# Altium schematic symbol library LATTICEPLDS_Library.SchLib: 291 symbols (part 4 of 32) (continued)
## LCMXO2-1200U/2K/4K/7K-FTG256 (continued)
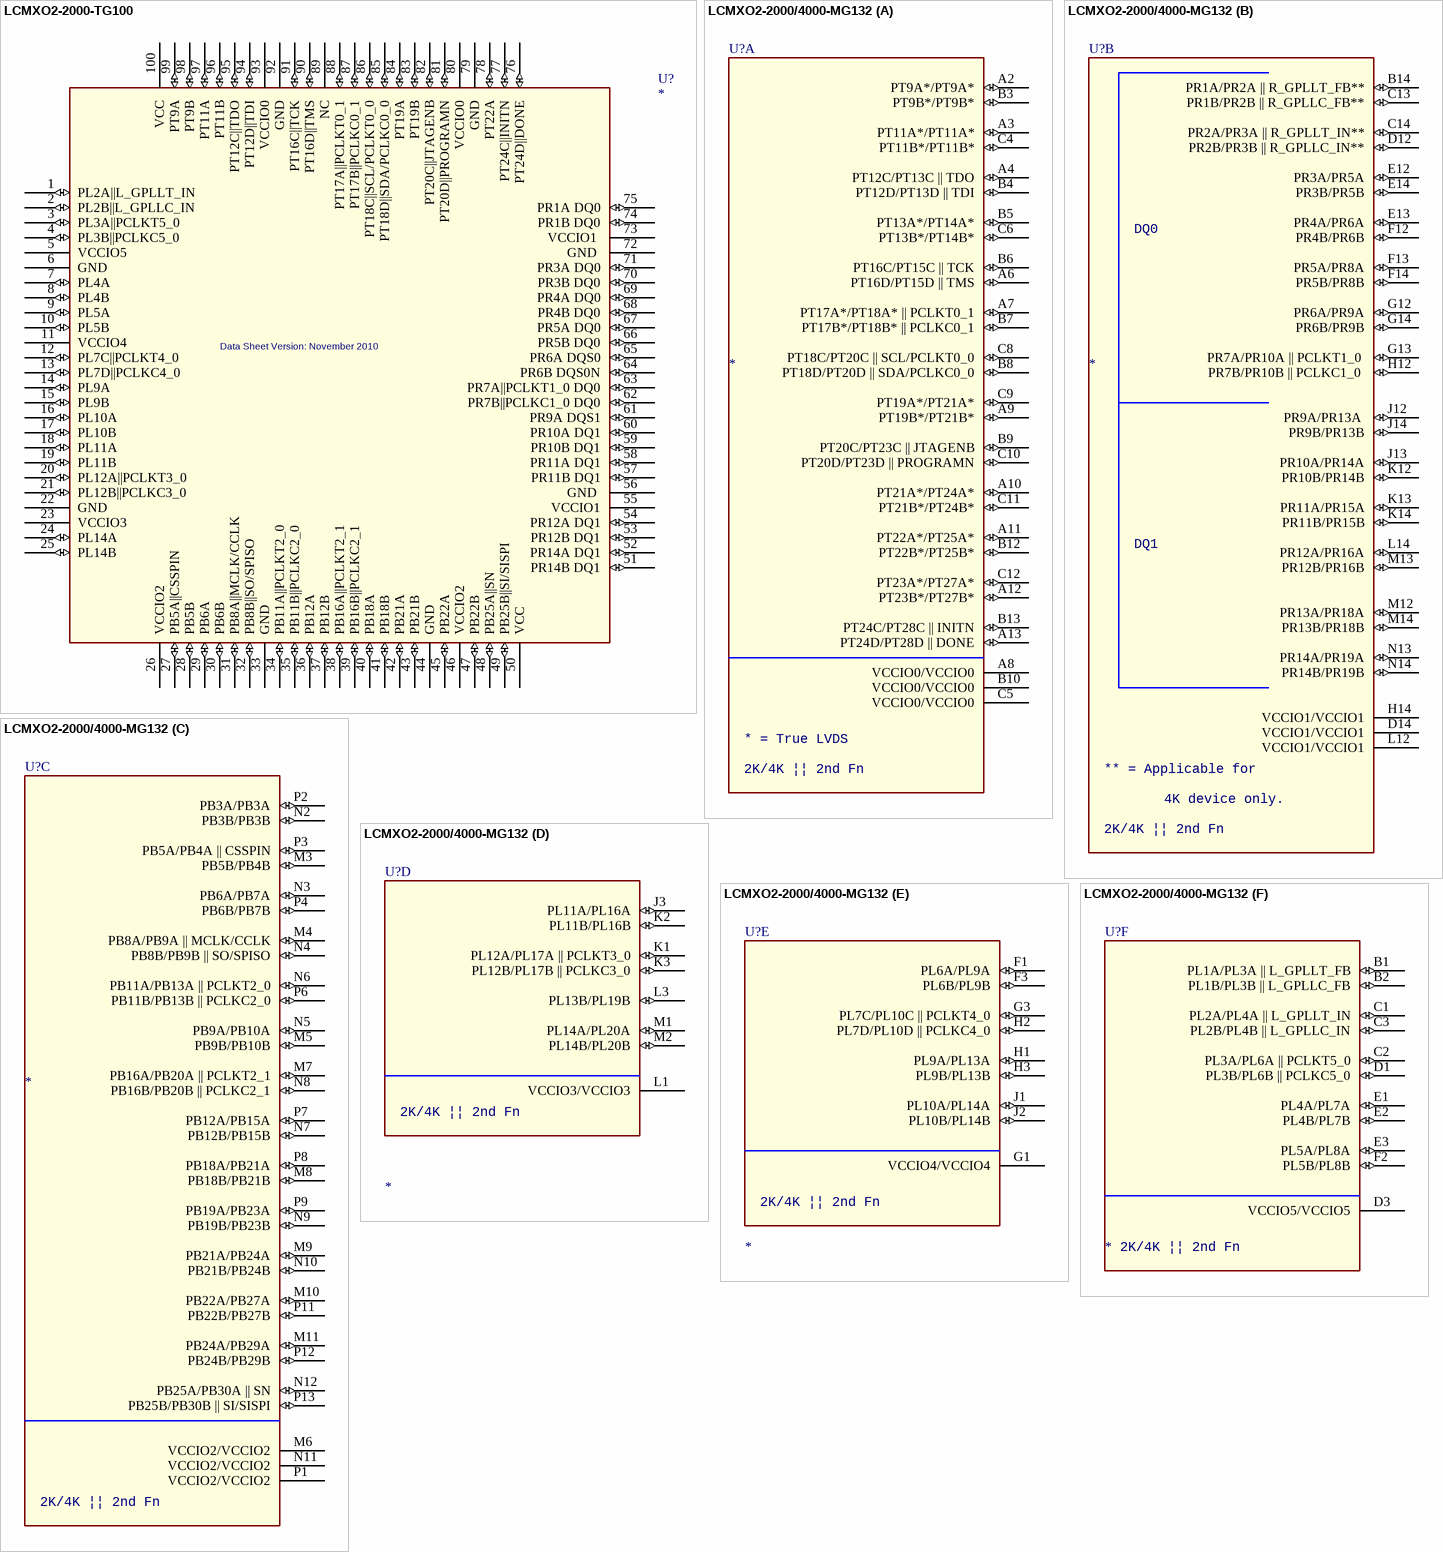
[diagram p41: symbols LCMXO2-2000-TG100 to LCMXO2-2000/4000-MG132]
part A text: 1200U&2K/4K/7K || ALL; (PRI. || SEC.); *=TRUE LVDS; *= Out. Gearbox; A,C = P; B,D = N
part B text: R_GPLL:; 4K&8K; Only; DQS0; DQS1; 1200U&2K/4K/7K || ALL; (PRI. || SEC.); A,C = P; B,D = N
part C text: 1200U&2K/4K/7K || ALL; (PRI. || SEC.); A,C = P; B,D = N; @ = In. Gearbox
part D text: 1200U&2K/4K/7K || ALL; (PRI. || SEC.); A,C = P; B,D = N
part E text: 1200U&2K/4K/7K || ALL; (PRI. || SEC.); A,C = P; B,D = N
part F text: 1200U&2K/4K/7K || ALL; (PRI. || SEC.); A,C = P; B,D = N

## LCMXO2-2000-TG100
designator U?  Data Sheet Version: November 2010
pins: 1 PL2A||L_GPLLT_IN  (io), 2 PL2B||L_GPLLC_IN  (io), 3 PL3A||PCLKT5_0  (io), 4 PL3B||PCLKC5_0  (io), 5 VCCIO5  (power), 6 GND  (power), 7 PL4A  (io), 8 PL4B  (io), 9 PL5A  (io), 10 PL5B  (io), 11 VCCIO4  (power), 12 PL7C||PCLKT4_0  (io), 13 PL7D||PCLKC4_0  (io), 14 PL9A  (io), 15 PL9B  (io), 16 PL10A  (io), 17 PL10B  (io), 18 PL11A  (io), 19 PL11B  (io), 20 PL12A||PCLKT3_0  (io), 21 PL12B||PCLKC3_0  (io), 22 GND  (power), 23 VCCIO3  (power), 24 PL14A  (io), 25 PL14B  (io), 26 VCCIO2  (power), 27 PB5A||CSSPIN  (io), 28 PB5B  (io), 29 PB6A  (io), 30 PB6B  (io), 31 PB8A||MCLK/CCLK  (io), 32 PB8B||SO/SPISO  (io), 33 GND  (power), 34 PB11A||PCLKT2_0  (io), 35 PB11B||PCLKC2_0  (io), 36 PB12A  (io), 37 PB12B  (io), 38 PB16A||PCLKT2_1  (io), 39 PB16B||PCLKC2_1  (io), 40 PB18A  (io), 41 PB18B  (io), 42 PB21A  (io), 43 PB21B  (io), 44 GND  (power), 45 PB22A  (io), 46 VCCIO2  (power), 47 PB22B  (io), 48 PB25A||SN  (io), 49 PB25B||SI/SISPI  (io), 50 VCC  (power), 51 PR14B DQ1 (io), 52 PR14A DQ1 (io), 53 PR12B DQ1 (io), 54 PR12A DQ1 (io), 55 VCCIO1 (power), 56 GND  (power), 57 PR11B DQ1 (io), 58 PR11A DQ1 (io), 59 PR10B DQ1 (io), 60 PR10A DQ1 (io), 61 PR9A DQS1 (io), 62 PR7B||PCLKC1_0 DQ0 (io), 63 PR7A||PCLKT1_0 DQ0 (io), 64 PR6B DQS0N (io), 65 PR6A DQS0 (io), 66 PR5B DQ0 (io), 67 PR5A DQ0 (io), 68 PR4B DQ0 (io), 69 PR4A DQ0 (io), 70 PR3B DQ0 (io), 71 PR3A DQ0 (io), 72 GND  (power), 73 VCCIO1  (power), 74 PR1B DQ0 (io), 75 PR1A DQ0 (io), 76 PT24D||DONE  (io), 77 PT24C||INITN  (io), 78 PT22A  (io), 79 GND  (power), 80 VCCIO0  (power), 81 PT20D||PROGRAMN  (io), 82 PT20C||JTAGENB  (io), 83 PT19B  (io), 84 PT19A  (io), 85 PT18D||SDA/PCLKC0_0  (io), 86 PT18C||SCL/PCLKT0_0  (io), 87 PT17B||PCLKC0_1  (io), 88 PT17A||PCLKT0_1  (io), 89 NC , 90 PT16D||TMS  (io), 91 PT16C||TCK  (io), 92 GND  (power), 93 VCCIO0  (power), 94 PT12D||TDI  (io), 95 PT12C||TDO  (io), 96 PT11B  (io), 97 PT11A  (io), 98 PT9B  (io), 99 PT9A  (io), 100 VCC  (power)

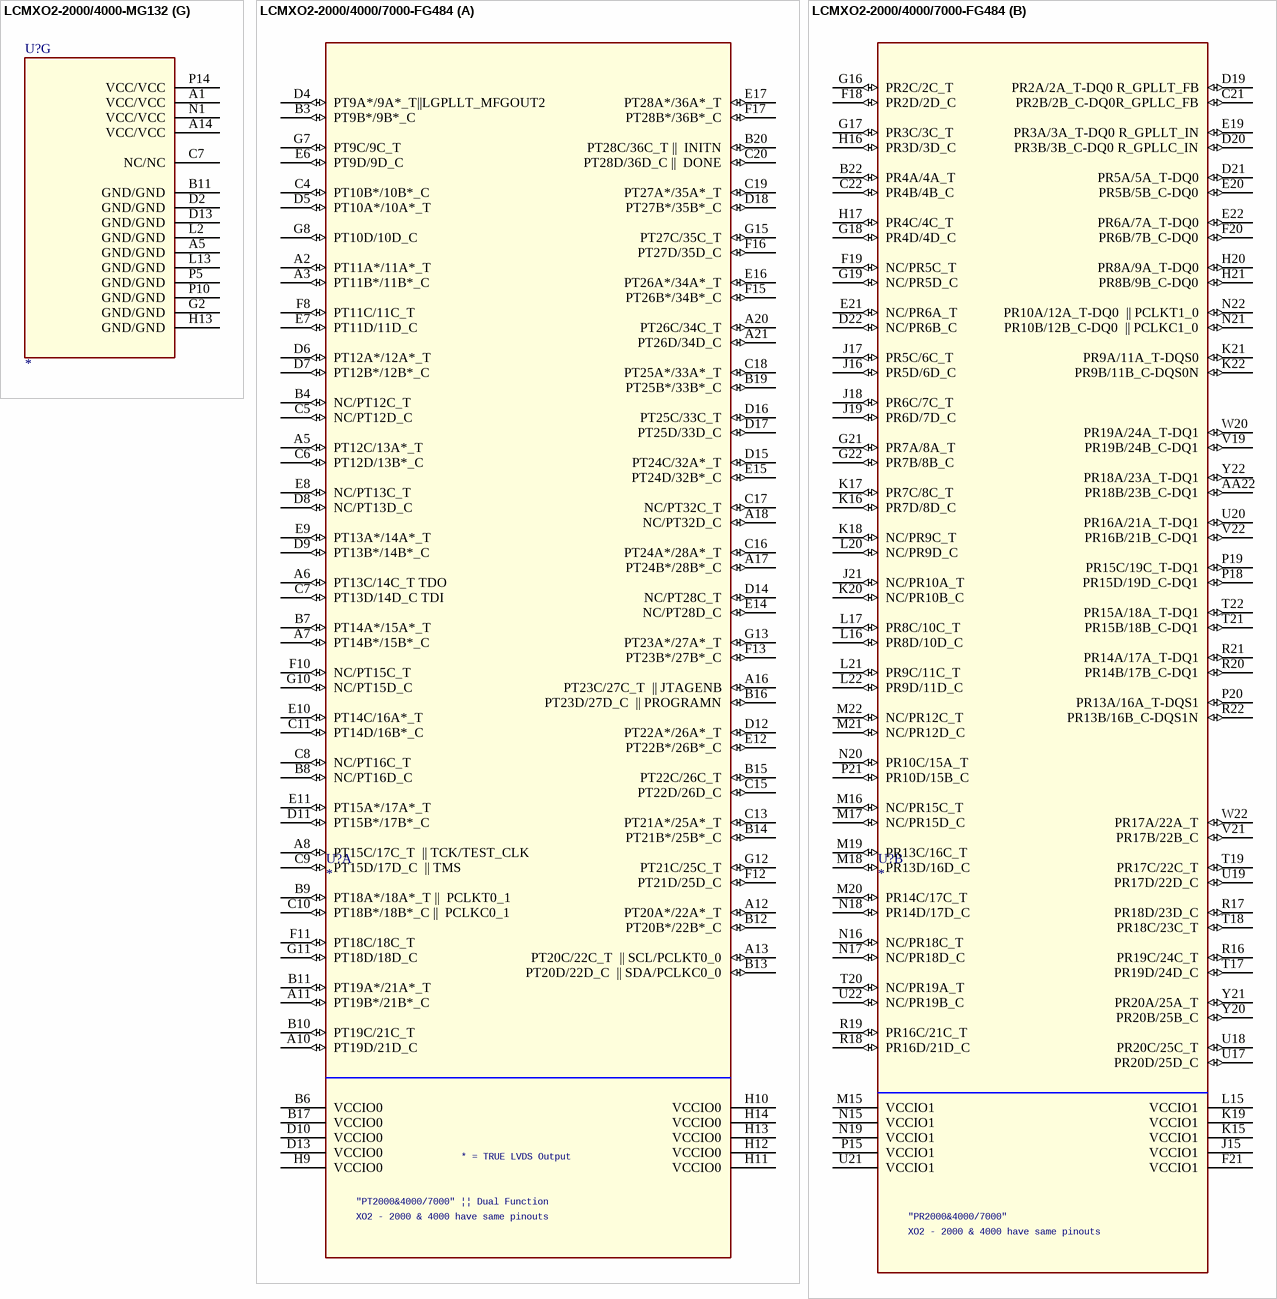
[diagram p42: symbols LCMXO2-2000/4000-MG132 to LCMXO2-2000/4000/7000-FG484]

## LCMXO2-2000/4000-MG132
designator U?
SPLIT_INST: TRUE; SWAP_INFO: (S1+S2+S3+S4+S5+S6+S7)
part A pins: A2 PT9A*/PT9A* (io), A3 PT11A*/PT11A* (io), A4 PT12C/PT13C || TDO (io), A6 PT16D/PT15D || TMS (io), A7 PT17A*/PT18A* || PCLKT0_1 (io), A8 VCCIO0/VCCIO0 (power), A9 PT19B*/PT21B* (io), A10 PT21A*/PT24A* (io), A11 PT22A*/PT25A* (io), A12 PT23B*/PT27B* (io), A13 PT24D/PT28D || DONE (io), B3 PT9B*/PT9B* (io), B4 PT12D/PT13D || TDI (io), B5 PT13A*/PT14A* (io), B6 PT16C/PT15C || TCK (io), B7 PT17B*/PT18B* || PCLKC0_1 (io), B8 PT18D/PT20D || SDA/PCLKC0_0 (io), B9 PT20C/PT23C || JTAGENB (io), B10 VCCIO0/VCCIO0 (power), B12 PT22B*/PT25B* (io), B13 PT24C/PT28C || INITN (io), C4 PT11B*/PT11B* (io), C5 VCCIO0/VCCIO0 (power), C6 PT13B*/PT14B* (io), C8 PT18C/PT20C || SCL/PCLKT0_0 (io), C9 PT19A*/PT21A* (io), C10 PT20D/PT23D || PROGRAMN (io), C11 PT21B*/PT24B* (io), C12 PT23A*/PT27A* (io)
part B pins: B14 PR1A/PR2A || R_GPLLT_FB** (io), C13 PR1B/PR2B || R_GPLLC_FB** (io), C14 PR2A/PR3A || R_GPLLT_IN** (io), D12 PR2B/PR3B || R_GPLLC_IN** (io), D14 VCCIO1/VCCIO1 (power), E12 PR3A/PR5A (io), E13 PR4A/PR6A (io), E14 PR3B/PR5B (io), F12 PR4B/PR6B (io), F13 PR5A/PR8A (io), F14 PR5B/PR8B (io), G12 PR6A/PR9A (io), G13 PR7A/PR10A || PCLKT1_0  (io), G14 PR6B/PR9B (io), H12 PR7B/PR10B || PCLKC1_0  (io), H14 VCCIO1/VCCIO1 (power), J12 PR9A/PR13A  (io), J13 PR10A/PR14A (io), J14 PR9B/PR13B (io), K12 PR10B/PR14B (io), K13 PR11A/PR15A (io), K14 PR11B/PR15B (io), L12 VCCIO1/VCCIO1 (power), L14 PR12A/PR16A (io), M12 PR13A/PR18A (io), M13 PR12B/PR16B (io), M14 PR13B/PR18B (io), N13 PR14A/PR19A (io), N14 PR14B/PR19B (io)
part C pins: M3 PB5B/PB4B (io), M4 PB8A/PB9A || MCLK/CCLK (io), M5 PB9B/PB10B (io), M6 VCCIO2/VCCIO2 (power), M7 PB16A/PB20A || PCLKT2_1 (io), M8 PB18B/PB21B (io), M9 PB21A/PB24A (io), M10 PB22A/PB27A (io), M11 PB24A/PB29A (io), N2 PB3B/PB3B (io), N3 PB6A/PB7A (io), N4 PB8B/PB9B || SO/SPISO (io), N5 PB9A/PB10A (io), N6 PB11A/PB13A || PCLKT2_0 (io), N7 PB12B/PB15B (io), N8 PB16B/PB20B || PCLKC2_1 (io), N9 PB19B/PB23B (io), N10 PB21B/PB24B (io), N11 VCCIO2/VCCIO2 (power), N12 PB25A/PB30A || SN (io), P1 VCCIO2/VCCIO2 (power), P2 PB3A/PB3A (io), P3 PB5A/PB4A || CSSPIN (io), P4 PB6B/PB7B (io), P6 PB11B/PB13B || PCLKC2_0 (io), P7 PB12A/PB15A (io), P8 PB18A/PB21A (io), P9 PB19A/PB23A (io), P11 PB22B/PB27B (io), P12 PB24B/PB29B (io), P13 PB25B/PB30B || SI/SISPI (io)
part D pins: J3 PL11A/PL16A (io), K1 PL12A/PL17A || PCLKT3_0 (io), K2 PL11B/PL16B (io), K3 PL12B/PL17B || PCLKC3_0 (io), L1 VCCIO3/VCCIO3 (power), L3 PL13B/PL19B (io), M1 PL14A/PL20A (io), M2 PL14B/PL20B (io)
part E pins: F1 PL6A/PL9A (io), F3 PL6B/PL9B (io), G1 VCCIO4/VCCIO4 (power), G3 PL7C/PL10C || PCLKT4_0 (io), H1 PL9A/PL13A (io), H2 PL7D/PL10D || PCLKC4_0 (io), H3 PL9B/PL13B (io), J1 PL10A/PL14A (io), J2 PL10B/PL14B (io)
part F pins: B1 PL1A/PL3A || L_GPLLT_FB (io), B2 PL1B/PL3B || L_GPLLC_FB (io), C1 PL2A/PL4A || L_GPLLT_IN (io), C2 PL3A/PL6A || PCLKT5_0 (io), C3 PL2B/PL4B || L_GPLLC_IN (io), D1 PL3B/PL6B || PCLKC5_0 (io), D3 VCCIO5/VCCIO5 (power), E1 PL4A/PL7A (io), E2 PL4B/PL7B (io), E3 PL5A/PL8A (io), F2 PL5B/PL8B (io)
part G pins: A1 VCC/VCC (power), A5 GND/GND (power), A14 VCC/VCC (power), B11 GND/GND (power), C7 NC/NC, D2 GND/GND (power), D13 GND/GND (power), G2 GND/GND (power), H13 GND/GND (power), L2 GND/GND (power), L13 GND/GND (power), N1 VCC/VCC (power), P5 GND/GND (power), P10 GND/GND (power), P14 VCC/VCC (power)
part A text: * = True LVDS; 2K/4K || 2nd Fn
part B text: DQ0; DQ1; ** = Applicable for; 4K device only.; 2K/4K || 2nd Fn
part C text: 2K/4K || 2nd Fn
part D text: 2K/4K || 2nd Fn
part E text: 2K/4K || 2nd Fn
part F text: 2K/4K || 2nd Fn

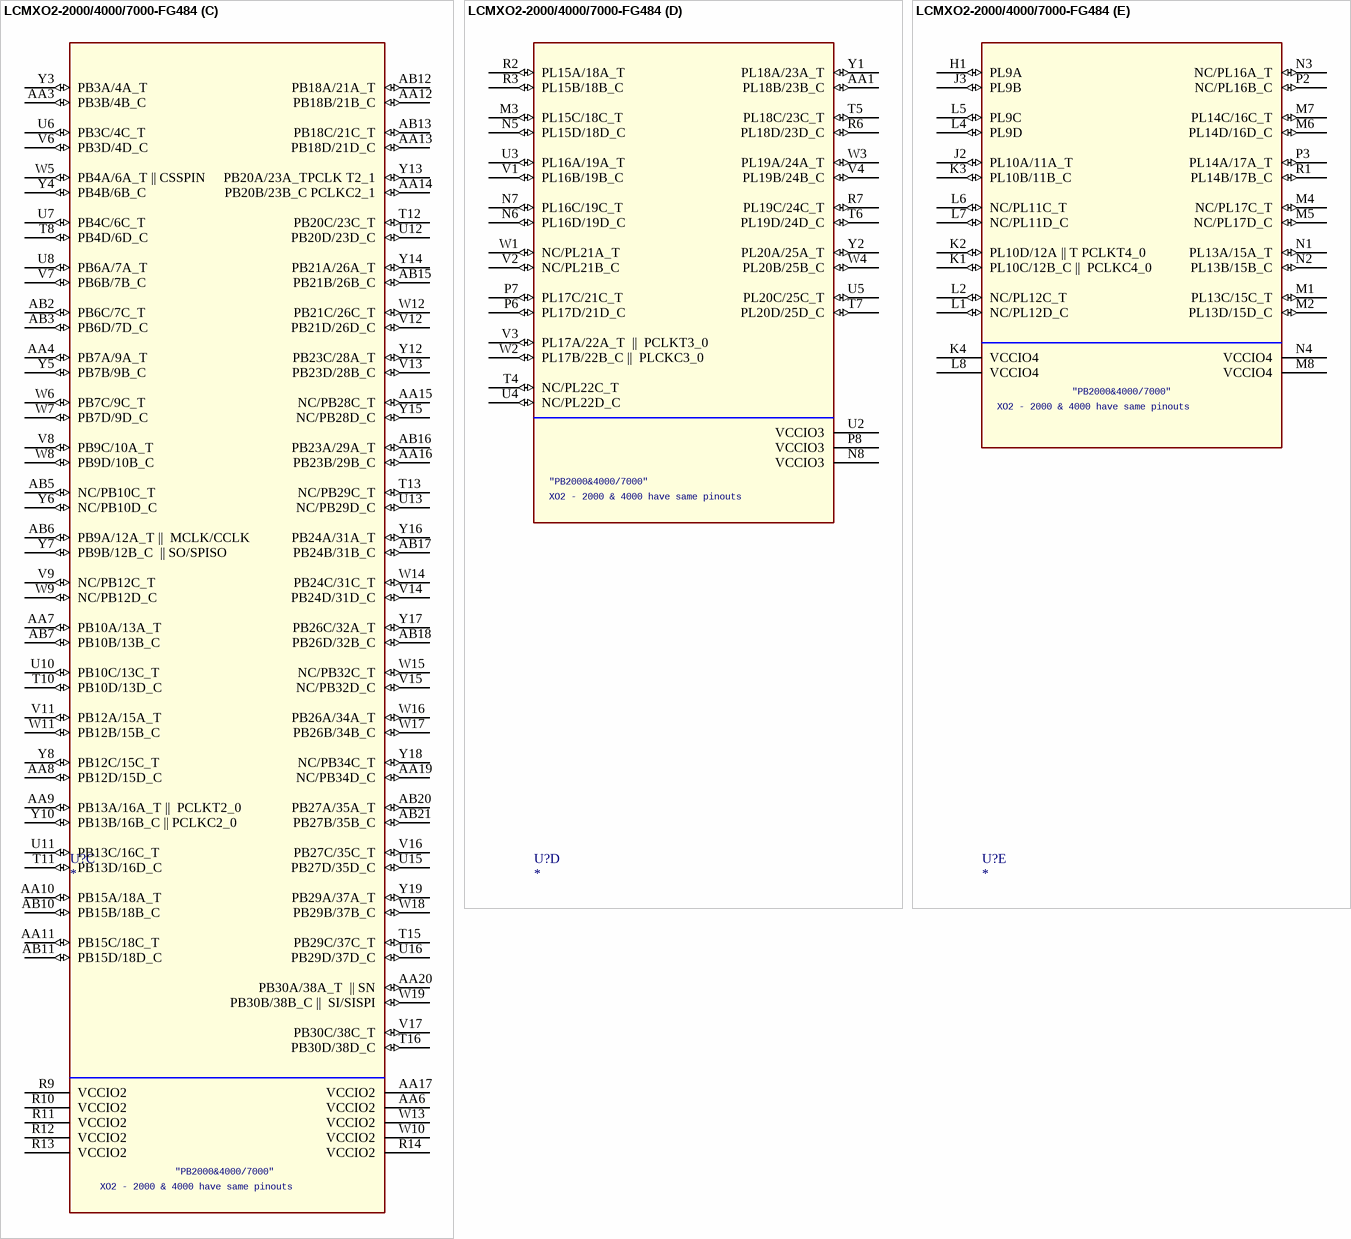
[diagram p43: symbol LCMXO2-2000/4000/7000-FG484]

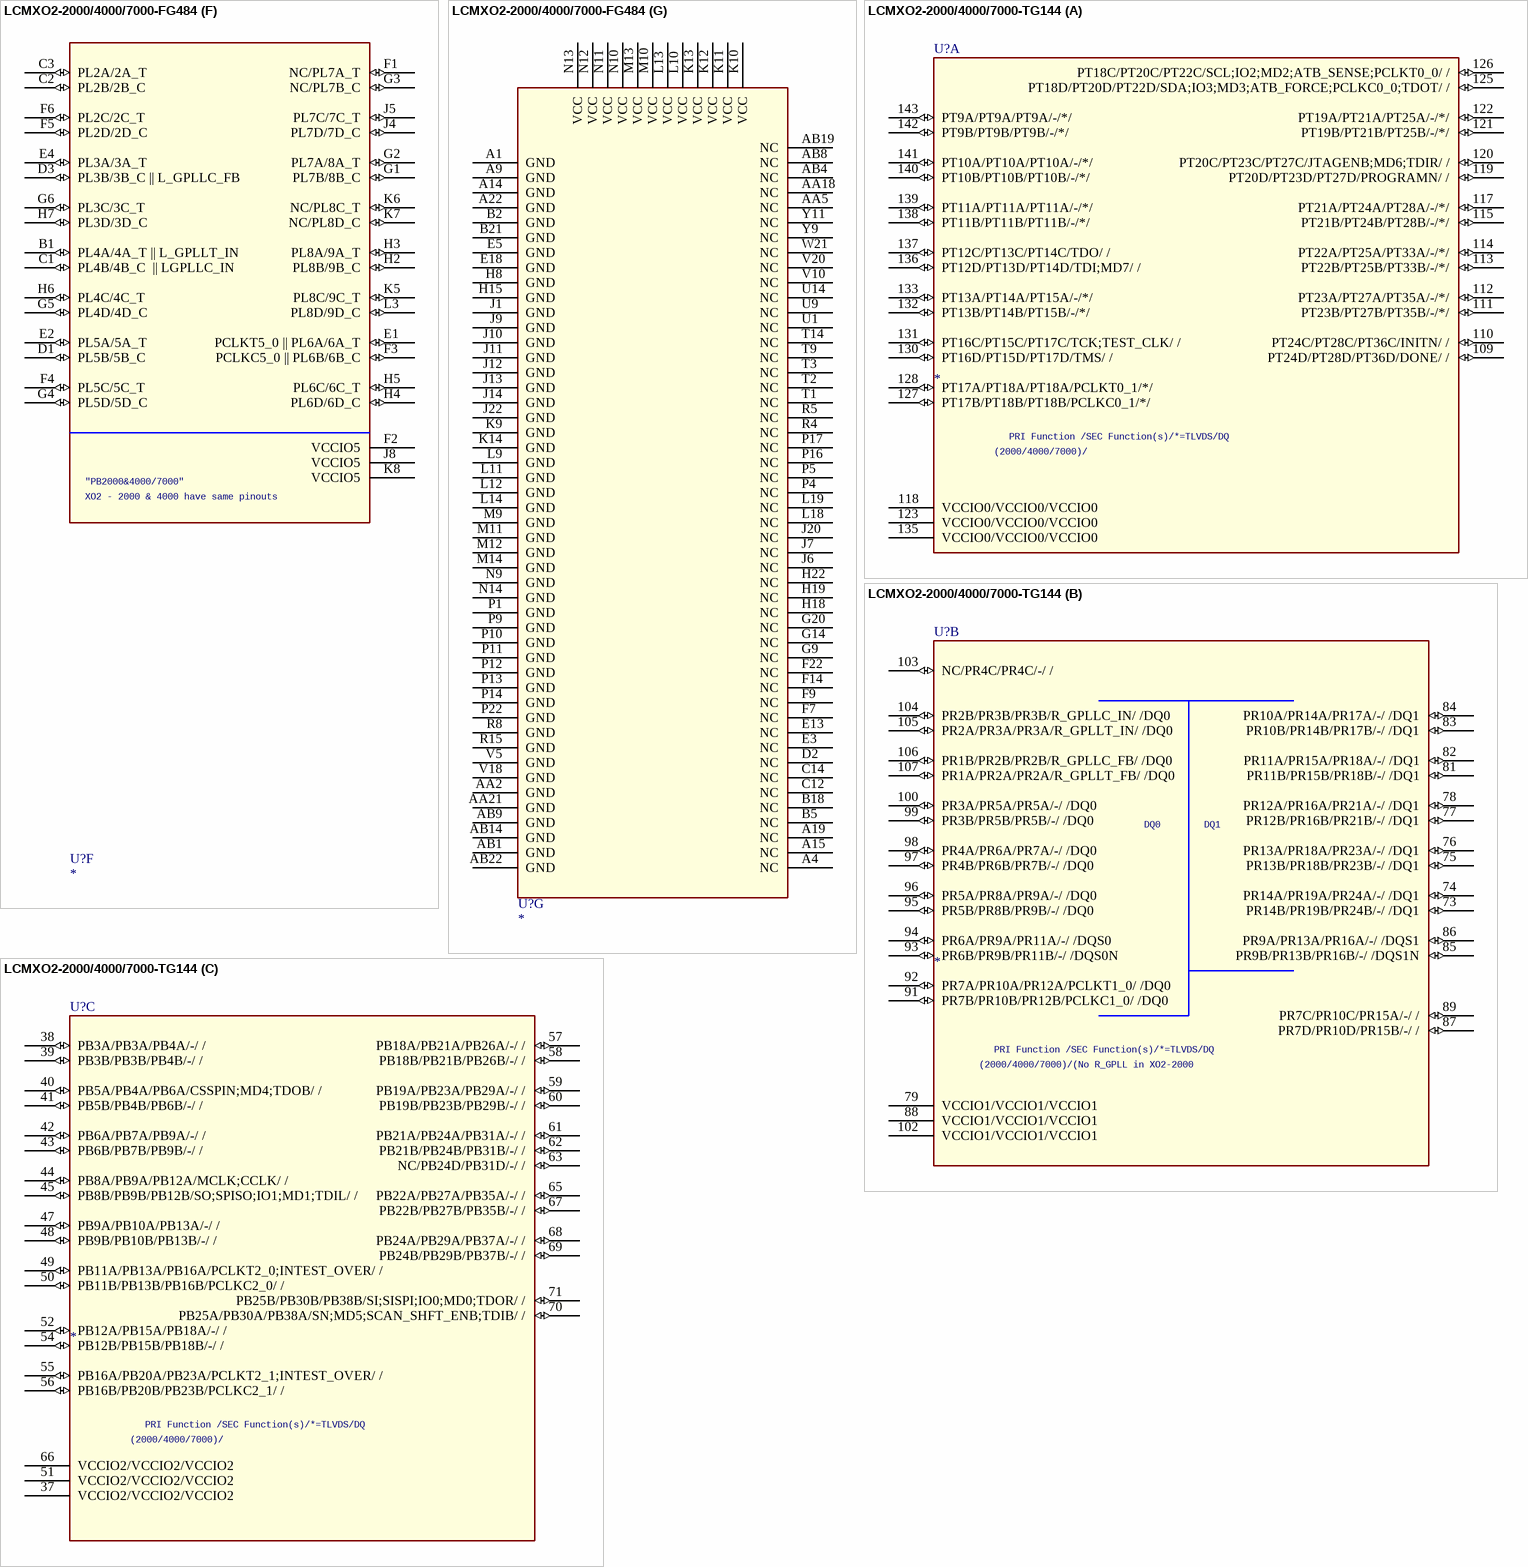
[diagram p44: symbols LCMXO2-2000/4000/7000-FG484 to LCMXO2-2000/4000/7000-TG144]

## LCMXO2-2000/4000/7000-FG484
designator U?
SPLIT_INST: TRUE; SWAP_INFO: (S1+S2+S3+S4+S5+S6+S7)
part A pins: A2 PT11A*/11A*_T (io), A3 PT11B*/11B*_C (io), A5 PT12C/13A*_T (io), A6 PT13C/14C_T TDO (io), A7 PT14B*/15B*_C (io), A8 PT15C/17C_T  || TCK/TEST_CLK (io), A10 PT19D/21D_C (io), A11 PT19B*/21B*_C (io), A12 PT20A*/22A*_T (io), A13 PT20C/22C_T  || SCL/PCLKT0_0 (io), A16 PT23C/27C_T  || JTAGENB (io), A17 PT24B*/28B*_C (io), A18 NC/PT32D_C (io), A20 PT26C/34C_T (io), A21 PT26D/34D_C (io), B3 PT9B*/9B*_C (io), B4 NC/PT12C_T (io), B6 VCCIO0 (power), B7 PT14A*/15A*_T (io), B8 NC/PT16D_C (io), B9 PT18A*/18A*_T ||  PCLKT0_1 (io), B10 PT19C/21C_T (io), B11 PT19A*/21A*_T (io), B12 PT20B*/22B*_C (io), B13 PT20D/22D_C  || SDA/PCLKC0_0 (io), B14 PT21B*/25B*_C (io), B15 PT22C/26C_T (io), B16 PT23D/27D_C  || PROGRAMN (io), B17 VCCIO0 (power), B19 PT25B*/33B*_C (io), B20 PT28C/36C_T ||  INITN (io), C4 PT10B*/10B*_C (io), C5 NC/PT12D_C (io), C6 PT12D/13B*_C (io), C7 PT13D/14D_C TDI (io), C8 NC/PT16C_T (io), C9 PT15D/17D_C  || TMS (io), C10 PT18B*/18B*_C ||  PCLKC0_1 (io), C11 PT14D/16B*_C (io), C13 PT21A*/25A*_T (io), C15 PT22D/26D_C (io), C16 PT24A*/28A*_T (io), C17 NC/PT32C_T (io), C18 PT25A*/33A*_T (io), C19 PT27A*/35A*_T (io), C20 PT28D/36D_C ||  DONE (io), D4 PT9A*/9A*_T||LGPLLT_MFGOUT2 (io), D5 PT10A*/10A*_T (io), D6 PT12A*/12A*_T (io), D7 PT12B*/12B*_C (io), D8 NC/PT13D_C (io), D9 PT13B*/14B*_C (io), D10 VCCIO0 (power), D11 PT15B*/17B*_C (io), D12 PT22A*/26A*_T (io), D13 VCCIO0 (power), D14 NC/PT28C_T (io), D15 PT24C/32A*_T (io), D16 PT25C/33C_T (io), D17 PT25D/33D_C (io), D18 PT27B*/35B*_C (io), E6 PT9D/9D_C (io), E7 PT11D/11D_C (io), E8 NC/PT13C_T (io), E9 PT13A*/14A*_T (io), E10 PT14C/16A*_T (io), E11 PT15A*/17A*_T (io), E12 PT22B*/26B*_C (io), E14 NC/PT28D_C (io), E15 PT24D/32B*_C (io), E16 PT26A*/34A*_T (io), E17 PT28A*/36A*_T (io), F8 PT11C/11C_T (io), F10 NC/PT15C_T (io), F11 PT18C/18C_T (io), F12 PT21D/25D_C (io), F13 PT23B*/27B*_C (io), F15 PT26B*/34B*_C (io), F16 PT27D/35D_C (io), F17 PT28B*/36B*_C (io), G7 PT9C/9C_T (io), G8 PT10D/10D_C (io), G10 NC/PT15D_C (io), G11 PT18D/18D_C (io), G12 PT21C/25C_T (io), G13 PT23A*/27A*_T (io), G15 PT27C/35C_T (io), H9 VCCIO0 (power), H10 VCCIO0 (power), H11 VCCIO0 (power), H12 VCCIO0 (power), H13 VCCIO0 (power), H14 VCCIO0 (power)
part B pins: AA22 PR18B/23B_C-DQ1 (io), B22 PR4A/4A_T (io), C21 PR2B/2B_C-DQ0R_GPLLC_FB (io), C22 PR4B/4B_C (io), D19 PR2A/2A_T-DQ0 R_GPLLT_FB (io), D20 PR3B/3B_C-DQ0 R_GPLLC_IN (io), D21 PR5A/5A_T-DQ0 (io), D22 NC/PR6B_C (io), E19 PR3A/3A_T-DQ0 R_GPLLT_IN (io), E20 PR5B/5B_C-DQ0 (io), E21 NC/PR6A_T (io), E22 PR6A/7A_T-DQ0 (io), F18 PR2D/2D_C (io), F19 NC/PR5C_T (io), F20 PR6B/7B_C-DQ0 (io), F21 VCCIO1 (power), G16 PR2C/2C_T (io), G17 PR3C/3C_T (io), G18 PR4D/4D_C (io), G19 NC/PR5D_C (io), G21 PR7A/8A_T (io), G22 PR7B/8B_C (io), H16 PR3D/3D_C (io), H17 PR4C/4C_T (io), H20 PR8A/9A_T-DQ0 (io), H21 PR8B/9B_C-DQ0 (io), J15 VCCIO1 (power), J16 PR5D/6D_C (io), J17 PR5C/6C_T (io), J18 PR6C/7C_T (io), J19 PR6D/7D_C (io), J21 NC/PR10A_T (io), K15 VCCIO1 (power), K16 PR7D/8D_C (io), K17 PR7C/8C_T (io), K18 NC/PR9C_T (io), K19 VCCIO1 (power), K20 NC/PR10B_C (io), K21 PR9A/11A_T-DQS0 (io), K22 PR9B/11B_C-DQS0N (io), L15 VCCIO1 (power), L16 PR8D/10D_C (io), L17 PR8C/10C_T (io), L20 NC/PR9D_C (io), L21 PR9C/11C_T (io), L22 PR9D/11D_C (io), M15 VCCIO1 (power), M16 NC/PR15C_T (io), M17 NC/PR15D_C (io), M18 PR13D/16D_C (io), M19 PR13C/16C_T (io), M20 PR14C/17C_T (io), M21 NC/PR12D_C (io), M22 NC/PR12C_T (io), N15 VCCIO1 (power), N16 NC/PR18C_T (io), N17 NC/PR18D_C (io), N18 PR14D/17D_C (io), N19 VCCIO1 (power), N20 PR10C/15A_T (io), N21 PR10B/12B_C-DQ0  || PCLKC1_0 (io), N22 PR10A/12A_T-DQ0  || PCLKT1_0 (io), P15 VCCIO1 (power), P18 PR15D/19D_C-DQ1 (io), P19 PR15C/19C_T-DQ1 (io), P20 PR13A/16A_T-DQS1 (io), P21 PR10D/15B_C (io), R16 PR19C/24C_T (io), R17 PR18D/23D_C (io), R18 PR16D/21D_C (io), R19 PR16C/21C_T (io), R20 PR14B/17B_C-DQ1 (io), R21 PR14A/17A_T-DQ1 (io), R22 PR13B/16B_C-DQS1N (io), T17 PR19D/24D_C (io), T18 PR18C/23C_T (io), T19 PR17C/22C_T (io), T20 NC/PR19A_T (io), T21 PR15B/18B_C-DQ1 (io), T22 PR15A/18A_T-DQ1 (io), U17 PR20D/25D_C (io), U18 PR20C/25C_T (io), U19 PR17D/22D_C (io), U20 PR16A/21A_T-DQ1 (io), U21 VCCIO1 (power), U22 NC/PR19B_C (io), V19 PR19B/24B_C-DQ1 (io), V21 PR17B/22B_C (io), V22 PR16B/21B_C-DQ1 (io), W20 PR19A/24A_T-DQ1 (io), W22 PR17A/22A_T (io), Y20 PR20B/25B_C (io), Y21 PR20A/25A_T (io), Y22 PR18A/23A_T-DQ1 (io)
part C pins: AA3 PB3B/4B_C (io), AA4 PB7A/9A_T (io), AA6 VCCIO2 (power), AA7 PB10A/13A_T (io), AA8 PB12D/15D_C (io), AA9 PB13A/16A_T ||  PCLKT2_0 (io), AA10 PB15A/18A_T (io), AA11 PB15C/18C_T (io), AA12 PB18B/21B_C (io), AA13 PB18D/21D_C (io), AA14 PB20B/23B_C PCLKC2_1 (io), AA15 NC/PB28C_T (io), AA16 PB23B/29B_C (io), AA17 VCCIO2 (power), AA19 NC/PB34D_C (io), AA20 PB30A/38A_T  || SN (io), AB2 PB6C/7C_T (io), AB3 PB6D/7D_C (io), AB5 NC/PB10C_T (io), AB6 PB9A/12A_T ||  MCLK/CCLK (io), AB7 PB10B/13B_C (io), AB10 PB15B/18B_C (io), AB11 PB15D/18D_C (io), AB12 PB18A/21A_T (io), AB13 PB18C/21C_T (io), AB15 PB21B/26B_C (io), AB16 PB23A/29A_T (io), AB17 PB24B/31B_C (io), AB18 PB26D/32B_C (io), AB20 PB27A/35A_T (io), AB21 PB27B/35B_C (io), R9 VCCIO2 (power), R10 VCCIO2 (power), R11 VCCIO2 (power), R12 VCCIO2 (power), R13 VCCIO2 (power), R14 VCCIO2 (power), T8 PB4D/6D_C (io), T10 PB10D/13D_C (io), T11 PB13D/16D_C (io), T12 PB20C/23C_T (io), T13 NC/PB29C_T (io), T15 PB29C/37C_T (io), T16 PB30D/38D_C (io), U6 PB3C/4C_T (io), U7 PB4C/6C_T (io), U8 PB6A/7A_T (io), U10 PB10C/13C_T (io), U11 PB13C/16C_T (io), U12 PB20D/23D_C (io), U13 NC/PB29D_C (io), U15 PB27D/35D_C (io), U16 PB29D/37D_C (io), V6 PB3D/4D_C (io), V7 PB6B/7B_C (io), V8 PB9C/10A_T (io), V9 NC/PB12C_T (io), V11 PB12A/15A_T (io), V12 PB21D/26D_C (io), V13 PB23D/28B_C (io), V14 PB24D/31D_C (io), V15 NC/PB32D_C (io), V16 PB27C/35C_T (io), V17 PB30C/38C_T (io), W5 PB4A/6A_T || CSSPIN (io), W6 PB7C/9C_T (io), W7 PB7D/9D_C (io), W8 PB9D/10B_C (io), W9 NC/PB12D_C (io), W10 VCCIO2 (power), W11 PB12B/15B_C (io), W12 PB21C/26C_T (io), W13 VCCIO2 (power), W14 PB24C/31C_T (io), W15 NC/PB32C_T (io), W16 PB26A/34A_T (io), W17 PB26B/34B_C (io), W18 PB29B/37B_C (io), W19 PB30B/38B_C ||  SI/SISPI (io), Y3 PB3A/4A_T (io), Y4 PB4B/6B_C (io), Y5 PB7B/9B_C (io), Y6 NC/PB10D_C (io), Y7 PB9B/12B_C  || SO/SPISO (io), Y8 PB12C/15C_T (io), Y10 PB13B/16B_C || PCLKC2_0 (io), Y12 PB23C/28A_T (io), Y13 PB20A/23A_TPCLK T2_1 (io), Y14 PB21A/26A_T (io), Y15 NC/PB28D_C (io), Y16 PB24A/31A_T (io), Y17 PB26C/32A_T (io), Y18 NC/PB34C_T (io), Y19 PB29A/37A_T (io)
part D pins: AA1 PL18B/23B_C (io), M3 PL15C/18C_T (io), N5 PL15D/18D_C (io), N6 PL16D/19D_C (io), N7 PL16C/19C_T (io), N8 VCCIO3 (power), P6 PL17D/21D_C (io), P7 PL17C/21C_T (io), P8 VCCIO3 (power), R2 PL15A/18A_T (io), R3 PL15B/18B_C (io), R6 PL18D/23D_C (io), R7 PL19C/24C_T (io), T4 NC/PL22C_T (io), T5 PL18C/23C_T (io), T6 PL19D/24D_C (io), T7 PL20D/25D_C (io), U2 VCCIO3 (power), U3 PL16A/19A_T (io), U4 NC/PL22D_C (io), U5 PL20C/25C_T (io), V1 PL16B/19B_C (io), V2 NC/PL21B_C (io), V3 PL17A/22A_T  ||  PCLKT3_0 (io), V4 PL19B/24B_C (io), W1 NC/PL21A_T (io), W2 PL17B/22B_C ||  PLCKC3_0 (io), W3 PL19A/24A_T (io), W4 PL20B/25B_C (io), Y1 PL18A/23A_T (io), Y2 PL20A/25A_T (io)
part E pins: H1 PL9A (io), J2 PL10A/11A_T (io), J3 PL9B (io), K1 PL10C/12B_C ||  PCLKC4_0 (io), K2 PL10D/12A || T PCLKT4_0 (io), K3 PL10B/11B_C (io), K4 VCCIO4 (power), L1 NC/PL12D_C (io), L2 NC/PL12C_T (io), L4 PL9D (io), L5 PL9C (io), L6 NC/PL11C_T (io), L7 NC/PL11D_C (io), L8 VCCIO4 (power), M1 PL13C/15C_T (io), M2 PL13D/15D_C (io), M4 NC/PL17C_T (io), M5 NC/PL17D_C (io), M6 PL14D/16D_C (io), M7 PL14C/16C_T (io), M8 VCCIO4 (power), N1 PL13A/15A_T (io), N2 PL13B/15B_C (io), N3 NC/PL16A_T (io), N4 VCCIO4 (power), P2 NC/PL16B_C (io), P3 PL14A/17A_T (io), R1 PL14B/17B_C (io)
part F pins: B1 PL4A/4A_T || L_GPLLT_IN (io), C1 PL4B/4B_C  || LGPLLC_IN (io), C2 PL2B/2B_C (io), C3 PL2A/2A_T (io), D1 PL5B/5B_C (io), D3 PL3B/3B_C || L_GPLLC_FB (io), E1 PCLKT5_0 || PL6A/6A_T (io), E2 PL5A/5A_T (io), E4 PL3A/3A_T (io), F1 NC/PL7A_T (io), F2 VCCIO5 (power), F3 PCLKC5_0 || PL6B/6B_C (io), F4 PL5C/5C_T (io), F5 PL2D/2D_C (io), F6 PL2C/2C_T (io), G1 PL7B/8B_C (io), G2 PL7A/8A_T (io), G3 NC/PL7B_C (io), G4 PL5D/5D_C (io), G5 PL4D/4D_C (io), G6 PL3C/3C_T (io), H2 PL8B/9B_C (io), H3 PL8A/9A_T (io), H4 PL6D/6D_C (io), H5 PL6C/6C_T (io), H6 PL4C/4C_T (io), H7 PL3D/3D_C (io), J4 PL7D/7D_C (io), J5 PL7C/7C_T (io), J8 VCCIO5 (power), K5 PL8C/9C_T (io), K6 NC/PL8C_T (io), K7 NC/PL8D_C (io), K8 VCCIO5 (power), L3 PL8D/9D_C (io)
part G pins: A1 GND (power), A4 NC, A9 GND (power), A14 GND (power), A15 NC, A19 NC, A22 GND (power), AA2 GND (power), AA5 NC, AA18 NC, AA21 GND (power), AB1 GND (power), AB4 NC, AB8 NC, AB9 GND (power), AB14 GND (power), AB19 NC, AB22 GND (power), B2 GND (power), B5 NC, B18 NC, B21 GND (power), C12 NC, C14 NC, D2 NC, E3 NC, E5 GND (power), E13 NC, E18 GND (power), F7 NC, F9 NC, F14 NC, F22 NC, G9 NC, G14 NC, G20 NC, H8 GND (power), H15 GND (power), H18 NC, H19 NC, H22 NC, J1 GND (power), J6 NC, J7 NC, J9 GND (power), J10 GND (power), J11 GND (power), J12 GND (power), J13 GND (power), J14 GND (power), J20 NC, J22 GND (power), K9 GND (power), K10 VCC (power), K11 VCC (power), K12 VCC (power), K13 VCC (power), K14 GND (power), L9 GND (power), L10 VCC (power), L11 GND (power), L12 GND (power), L13 VCC (power), L14 GND (power), L18 NC, L19 NC, M9 GND (power), M10 VCC (power), M11 GND (power), M12 GND (power), M13 VCC (power), M14 GND (power), N9 GND (power), N10 VCC (power), N11 VCC (power), N12 VCC (power), N13 VCC (power), N14 GND (power), P1 GND (power), P4 NC, P5 NC, P9 GND (power), P10 GND (power), P11 GND (power), P12 GND (power), P13 GND (power), P14 GND (power), P16 NC, P17 NC, P22 GND (power), R4 NC, R5 NC, R8 GND (power), R15 GND (power), T1 NC, T2 NC, T3 NC, T9 NC, T14 NC, U1 NC, U9 NC, U14 NC, V5 GND (power), V10 NC, V18 GND (power), V20 NC, W21 NC, Y9 NC, Y11 NC
part A text: * = TRUE LVDS Output; "PT2000&4000/7000" || Dual Function; XO2 - 2000 & 4000 have same pinouts
part B text: "PR2000&4000/7000"; XO2 - 2000 & 4000 have same pinouts
part C text: "PB2000&4000/7000"; XO2 - 2000 & 4000 have same pinouts
part D text: "PB2000&4000/7000"; XO2 - 2000 & 4000 have same pinouts
part E text: "PB2000&4000/7000"; XO2 - 2000 & 4000 have same pinouts
part F text: "PB2000&4000/7000"; XO2 - 2000 & 4000 have same pinouts

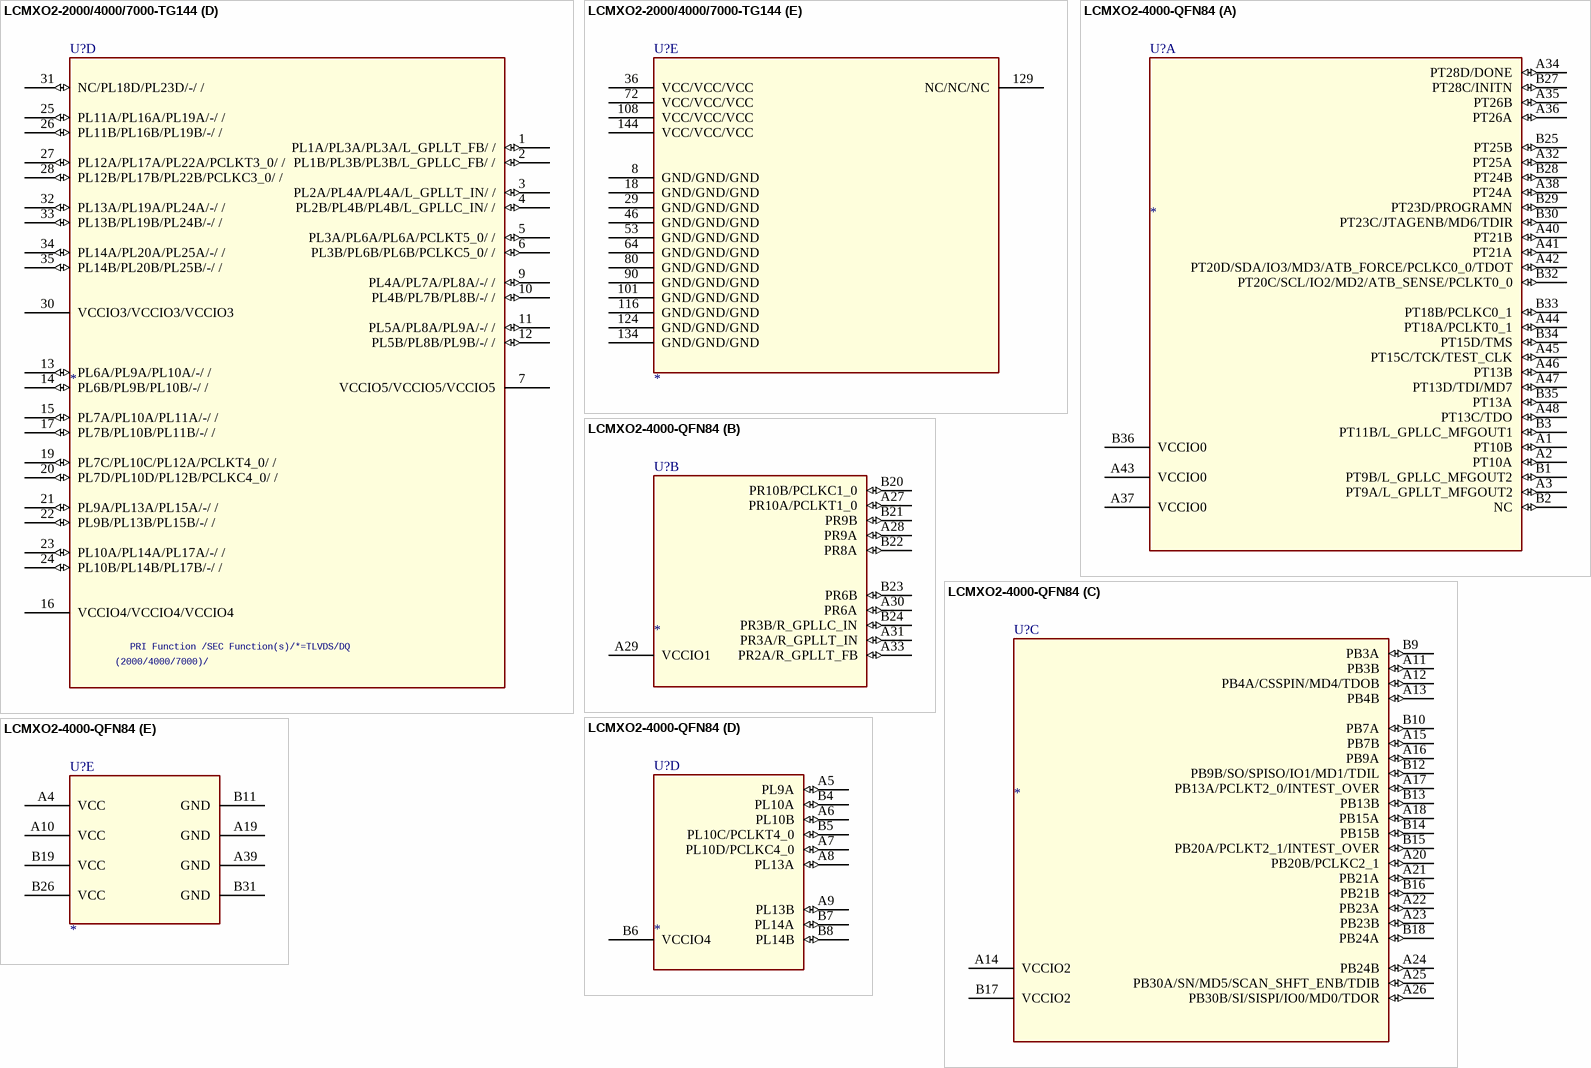
[diagram p45: symbols LCMXO2-2000/4000/7000-TG144 to LCMXO2-4000-QFN84]